# Altium footprint library HamedLib.PcbLib: 221 footprints (part 14 of 14)
Each footprint in its own frame and in the unit in brackets; x right, y up, seen from the top. Pads: shape width x height; smd on the part's side, far side on the other; paste and mask are expansions set on the pad; w line width, h text height; cw(c..) or ccw(c..) is an arc to the next point about the centre after c.
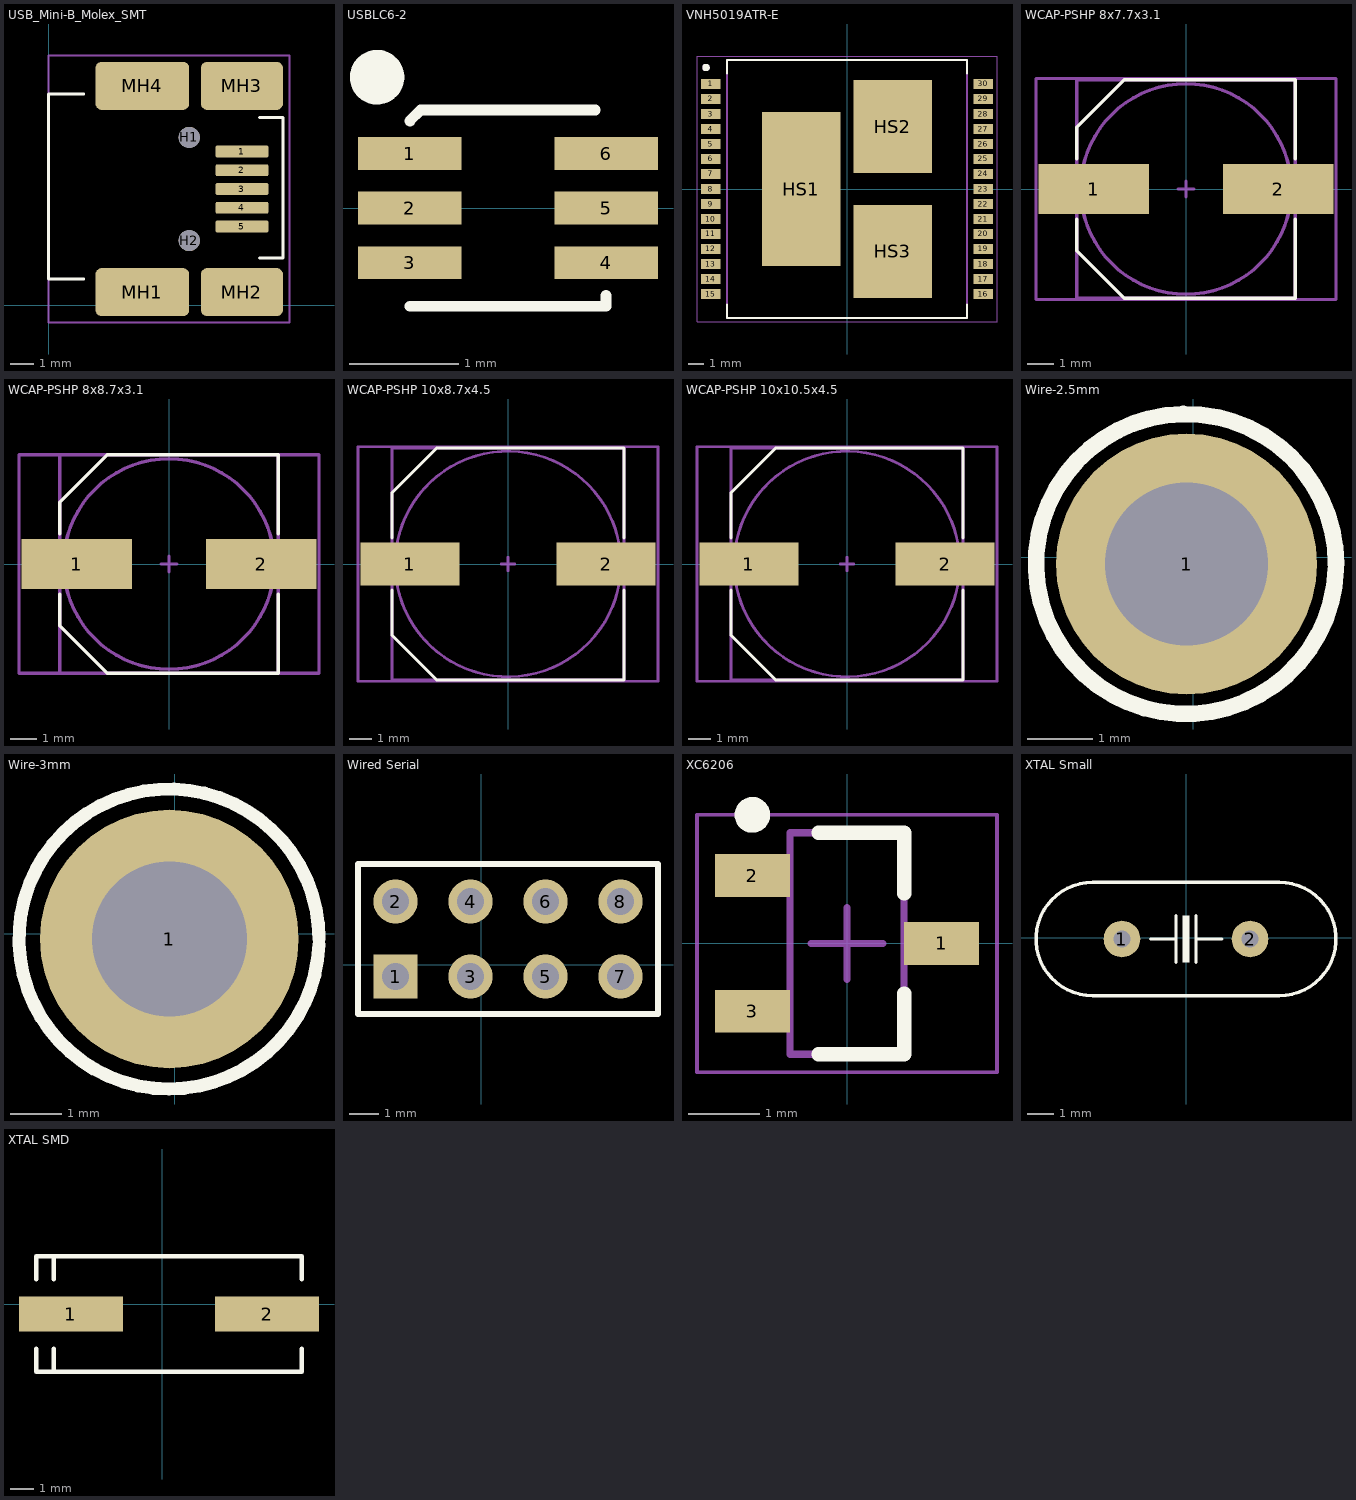
[diagram p13: the footprints below, top view; thin cyan lines are the x and y axes]

## USB_Mini-B_Molex_SMT [mm]
height 3.95
pads (11):
  rrect25% 2.25x0.5 smd: 1(8.25,6.55) 2(8.25,5.75) 3(8.25,4.95) 4(8.25,4.15) 5(8.25,3.35)
  round 0.9 hole 0.9 unplated: H1(6,7.15) H2(6,2.75)
  rrect25% 4x2.05 smd: MH1(4,0.55) MH4(4,9.35)
  rrect25% 3.5x2.05 smd: MH2(8.25,0.55) MH3(8.25,9.35)
Top Overlay:
  lines w0.127: 1.5,1.1 0,1.1 0,9 1.5,9 ; 9,2 10,2 10,8 9,8
Mechanical 15:
  lines w0.076: 0,-0.75 0,10.65 10.275,10.65 10.275,-0.75 0,-0.75
3D body: height 3.95, standoff 0, extent 0,1.1 9,9

## USBLC6-2 [mm] "USB ESD Protectection"
pads (6):
  rect 0.95x0.3 smd: 1(-2.9,0.5) 2(-2.9,0) 3(-2.9,-0.5) 4(-1.1,-0.5) 5(-1.1,0) 6(-1.1,0.5)
Top Overlay:
  circle w0.25: c-3.2,1.2 r0.125
  lines w0.1: -2.9,-0.9 -1.1,-0.9 -1.1,-0.8 ; -2.9,0.8 -2.8,0.9 -1.2,0.9
3D body "User Library-SOT-666.step": height 0.6, standoff 0, extent -2.85,-0.85 -1.15,0.85

## VNH5019ATR-E [mm]
pads (33):
  rect 1.3x0.665 smd: 1(-9.1,7) 2(-9.1,6) 3(-9.1,5) 4(-9.1,4) 5(-9.1,3) 6(-9.1,2) 7(-9.1,1) 8(-9.1,0) 9(-9.1,-1) 10(-9.1,-2) 11(-9.1,-3) 12(-9.1,-4) 13(-9.1,-5) 14(-9.1,-6) 15(-9.1,-7) 16(9.1,-7) 17(9.1,-6) 18(9.1,-5) 19(9.1,-4) 20(9.1,-3) 21(9.1,-2) 22(9.1,-1) 23(9.1,0) 24(9.1,1) 25(9.1,2) 26(9.1,3) 27(9.1,4) 28(9.1,5) 29(9.1,6) 30(9.1,7)
  rect 5.25x10.3 smd paste-6: HS1(-3.05,0)
  rect 5.25x6.23 smd paste-4: HS2(3.05,4.165) HS3(3.05,-4.165)
Top Overlay:
  circle w0.3: c-9.4,8.1 r0.1
  lines w0.127: -8,-7.7 -8,-8.6 8,-8.6 8,-7.7 ; -8,7.7 -8,8.6 8,8.6 8,7.7
Top Paste:
  region: 4.71,2.196 1.391,2.196 1.391,6.135 4.71,6.135
  region: 4.71,-6.136 1.39,-6.136 1.39,-2.195 4.71,-2.195
  region: -1.39,-3.257 -4.711,-3.257 -4.711,3.257 -1.39,3.257
Mechanical 13:
  circle w0.3: c-9.4,8.1 r0.1
  lines w0.127: -8,-8.6 -8,8.6 8,8.6 8,-8.6 -8,-8.6
Mechanical 15:
  lines w0.05: -10,-8.85 -10,8.85 10,8.85 10,-8.85 -10,-8.85

## WCAP-PSHP 8x7.7x3.1 [mm] "Polarized capacitors, Aluminum Polymer Capacitors, 2-Leads, Body 8x7.7x3.1"
height 7.7
pads (2):
  rect 4.2x1.9 smd: 1(-3.5,0) 2(3.5,0)
Top Overlay:
  lines w0.127: -4.15,-1.15 -4.15,-2.35 -2.35,-4.15 4.15,-4.15 4.15,-1.15 ; -4.15,1.15 -4.15,2.35 -2.35,4.15 4.15,4.15 4.15,1.15
Mechanical 13:
  circle w0.127: c0,0 r4
  lines w0.127: -4.15,-4.15 -4.15,4.15 4.15,4.15 4.15,-4.15 -4.15,-4.15
Mechanical 15:
  lines w0.127: -0.3,0 0.3,0 ; 0,-0.3 0,0.3 ; -5.7,-4.2 -5.7,4.2 5.7,4.2 5.7,-4.2 -5.7,-4.2
3D body "8x7.7x3.1.stp": height 7.65, standoff -0.05, extent -4.54,-4.17 4.46,4.13

## WCAP-PSHP 8x8.7x3.1 [mm] "Polarized capacitors, Aluminum Polymer Capacitors, 2-Leads, Body 8x8.7x3.1"
height 8.7
pads (2):
  rect 4.2x1.9 smd: 1(-3.5,0) 2(3.5,0)
Top Overlay:
  lines w0.127: -4.15,-1.15 -4.15,-2.35 -2.35,-4.15 4.15,-4.15 4.15,-1.15 ; -4.15,1.15 -4.15,2.35 -2.35,4.15 4.15,4.15 4.15,1.15
Mechanical 13:
  circle w0.127: c0,0 r4
  lines w0.127: -4.15,-4.15 4.15,-4.15 4.15,4.15 -4.15,4.15 -4.15,-4.15
Mechanical 15:
  lines w0.127: -0.3,0 0.3,0 ; 0,-0.3 0,0.3 ; -5.7,-4.15 5.7,-4.15 5.7,4.15 -5.7,4.15 -5.7,-4.15
3D body "8x8.7x3.1.stp": height -0.45, standoff -9.15, extent -4.5,-4.15 4.5,4.15

## WCAP-PSHP 10x8.7x4.5 [mm] "Polarized capacitors, Aluminum Polymer Capacitors, 2-Leads, Body 10x8.7x4.5"
height 8.7
pads (2):
  rect 4.4x1.9 smd: 1(-4.35,0) 2(4.35,0)
Top Overlay:
  lines w0.127: -5.15,-1.15 -5.15,-3.15 -3.15,-5.15 5.15,-5.15 5.15,-1.15 ; -5.15,1.15 -5.15,3.15 -3.15,5.15 5.15,5.15 5.15,1.15
Mechanical 13:
  circle w0.127: c0,0 r5
  lines w0.127: -5.15,-5.15 -5.15,5.15 5.15,5.15 5.15,-5.15 -5.15,-5.15
Mechanical 15:
  lines w0.127: -0.3,0 0.3,0 ; 0,-0.3 0,0.3 ; -6.65,-5.2 -6.65,5.2 6.65,5.2 6.65,-5.2 -6.65,-5.2
3D body "10x8.7x4.5.stp": height -0.4, standoff -9.1, extent -5.5,-5.15 5.5,5.15

## WCAP-PSHP 10x10.5x4.5 [mm] "Polarized capacitors, Aluminum Polymer Capacitors, 2-Leads, Body 10x10.5x4.5"
height 10.5
pads (2):
  rect 4.4x1.9 smd: 1(-4.35,0) 2(4.35,0)
Top Overlay:
  lines w0.127: -5.15,-1.15 -5.15,-3.15 -3.15,-5.15 5.15,-5.15 5.15,-1.15 ; -5.15,1.15 -5.15,3.15 -3.15,5.15 5.15,5.15 5.15,1.15
Mechanical 13:
  circle w0.127: c0,0 r5
  lines w0.127: -5.15,-5.15 -5.15,5.15 5.15,5.15 5.15,-5.15 -5.15,-5.15
Mechanical 15:
  lines w0.127: -0.3,0 0.3,0 ; 0,-0.3 0,0.3 ; -6.65,-5.2 6.65,-5.2 6.65,5.2 -6.65,5.2 -6.65,-5.2
3D body "10x10.5x4.5.stp": height -0.45, standoff -10.95, extent -5.5,-5.15 5.5,5.15

## Wire-2.5mm [mm] "12AWG"
pads (1):
  round 4 hole 2.5: 1(-0.1,-0.1)
Top Overlay:
  lines w0.254: 2.191,-0.182 cw(c-0.108,-0.1) 2.192,-0.1

## Wire-3mm [mm] "10AWG"
pads (1):
  round 5 hole 3: 1(-0.1,-0.1)
Top Overlay:
  lines w0.254: 2.79,-0.203 cw(c-0.108,-0.1) 2.792,-0.1

## Wired Serial [mm]
pads (8):
  rect 1.5x1.5 hole 0.9: 1(-2.9,-0.397)
  round 1.5 hole 0.9: 2(-2.9,2.143) 3(-0.36,-0.397) 4(-0.36,2.143) 5(2.18,-0.397) 6(2.18,2.143) 7(4.72,-0.397) 8(4.72,2.143)
Top Overlay:
  lines w0.2: -4.17,-1.667 -4.17,3.413 5.99,3.413 5.99,-1.667 -4.17,-1.667

## XC6206 [mm] "SOT23, 3-Leads, Body 3.00x2.80mm, Pitch 0.95mm, IPC Medium Density"
height 1.3
pads (3):
  rect 1.05x0.6 smd: 1(1.325,0) 2(-1.325,0.95) 3(-1.325,-0.95)
Top Overlay:
  circle w0.25: c-1.325,1.8 r0.125
  lines w0.2: -0.4,-1.55 0.8,-1.55 0.8,-0.7 ; -0.4,1.55 0.8,1.55 0.8,0.7
Mechanical 13:
  lines w0.1: -0.8,-1.55 -0.8,1.55 0.8,1.55 0.8,-1.55 -0.8,-1.55
Mechanical 15:
  lines w0.05: -2.1,-1.8 -2.1,1.8 2.1,1.8 2.1,-1.8 -2.1,-1.8
  lines w0.1: -0.5,0 0.5,0 ; 0,-0.5 0,0.5
3D body "SOT95P280X130-3N.step": height 1.3, standoff 0, extent -1.5,-1.55 1.5,1.55

## XTAL Small [mil]
pads (2):
  round 55 hole 25: 1(-96.43,-2) 2(95.7,-2)
Top Overlay:
  rectangle: -5.36,-37 4.64,33
  lines w5: -53.36,-2 -15.36,-2 ; -15.36,-37 -15.36,33 ; 14.64,-37 14.64,33 ; 14.64,-2 53.64,-2 ; -140.36,-87 cw(c-140.36,-2) -140.36,83 139.64,83 cw(c139.64,-2) 139.64,-87 -140.36,-87
3D body "User Library-XTAL.STEP": height 141.73, standoff -118.11, extent -217.13,-94.14 215.16,82.68

## XTAL SMD [mm]
pads (2):
  rect 4.5x1.5 smd: 1(-3.95,-0.43) 2(4.55,-0.43)
Top Overlay:
  lines w0.2: -5.45,-1.93 -5.45,-2.93 6.05,-2.93 6.05,-1.93 ; -5.45,1.07 -5.45,2.07 6.05,2.07 6.05,1.07 ; -4.7,-2.93 -4.7,-1.93 ; -4.7,1.07 -4.7,2.07
3D body "User Library-HC49_SMD.STEP": height 5.18, standoff 0, extent -5.909,-2.68 6.391,1.82